# Altium footprint library PcbLib1.PcbLib: 8 footprints
Each footprint in its own frame and in the unit in brackets; x right, y up, seen from the top. Pads: shape width x height; smd on the part's side, far side on the other; paste and mask are expansions set on the pad; w line width, h text height; cw(c..) or ccw(c..) is an arc to the next point about the centre after c.
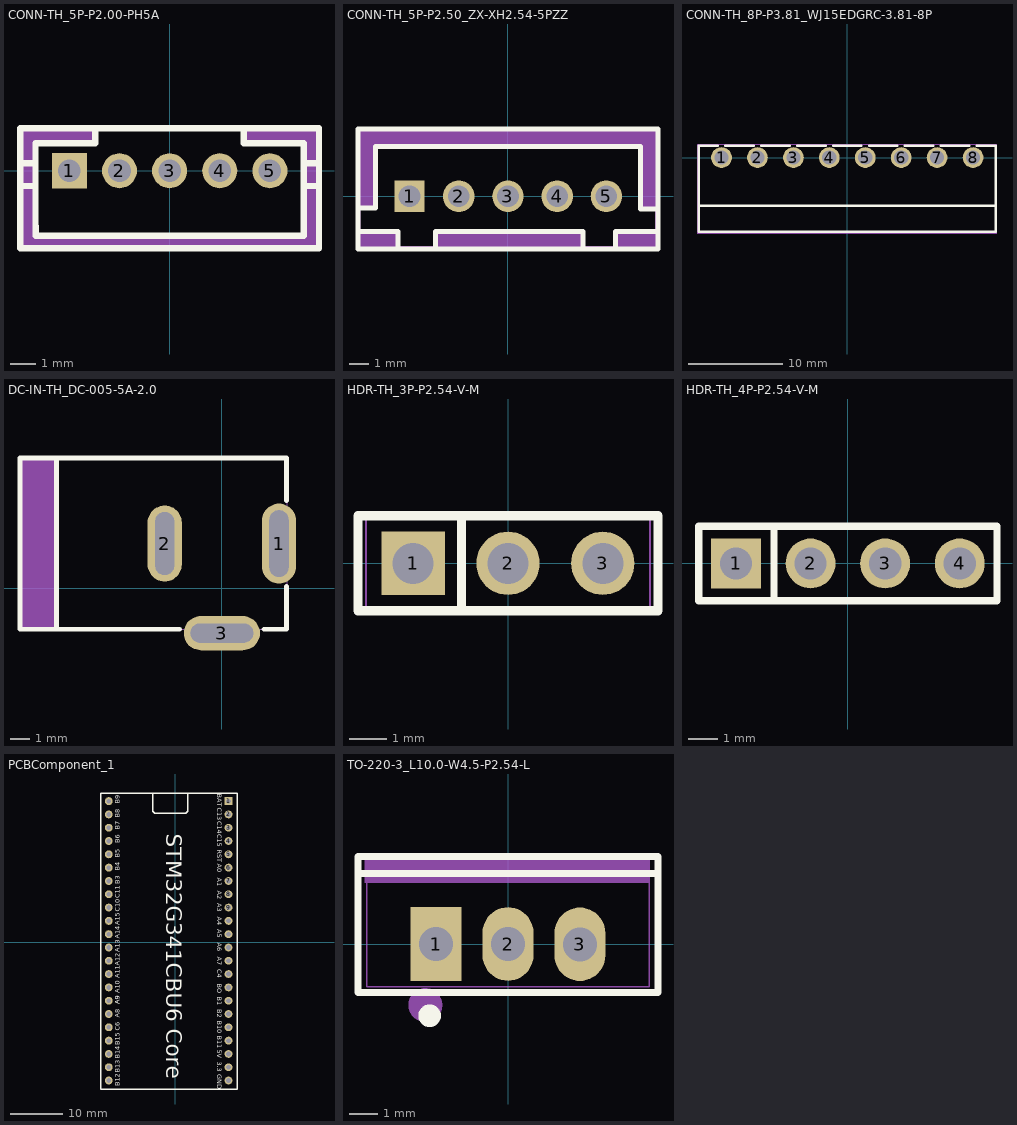
[diagram p0: the footprints below, top view; thin cyan lines are the x and y axes]

## CONN-TH_5P-P2.00-PH5A [mm]
pads (5):
  rect 1.4x1.4 hole 0.9: 1(-4,0)
  round 1.4 hole 0.9: 2(-2,0) 3(0,0) 4(2,0) 5(4,0)
Top Overlay:
  lines w0.254: -5.96,-2.794 -5.96,-0.61 ; -5.958,-2.794 -5.958,-3.099 5.959,-3.099 5.959,-2.794 ; -5.35,-2.21 -5.35,-0.61 ; -5.349,-2.21 -5.349,-2.601 5.35,-2.601 5.35,-2.21 ; 2.962,1.702 -2.962,1.702 ; 5.35,-2.21 5.35,-0.61 ; 5.96,-2.794 5.96,-0.61 ; -5.96,-0.61 -5.96,0.305 ; -5.96,-0.61 -5.35,-0.61 ; -5.96,0.305 -5.96,1.702 -2.962,1.702 ; -5.96,0.305 -5.35,0.305 ; -5.35,-0.61 -5.35,0.305 ; -5.35,0.305 -5.35,1.092 -2.962,1.092 -2.962,1.702 ; 5.35,-0.61 5.35,0.305 ; 5.35,-0.61 5.96,-0.61 ; 5.35,0.305 5.35,1.092 2.962,1.092 2.962,1.702 5.96,1.702 5.96,0.305 ; 5.35,0.305 5.96,0.305 ; 5.96,-0.61 5.96,0.305
Mechanical 6:
  region: 5.96,1.702 5.96,-3.098 5.959,-3.099 -5.958,-3.099 -5.958,1.701 -5.96,1.702 -2.962,1.702 -2.962,1.092 -5.35,1.092 -5.35,-2.6 -5.349,-2.601 5.35,-2.601 5.35,1.092 2.962,1.092 2.962,1.701 2.962,1.702
Mechanical 15:
  region: -3.75,-0.25 -4.25,-0.25 -4.25,0.25 -3.75,0.25
  region: -1.75,-0.25 -2.25,-0.25 -2.25,0.25 -1.75,0.25
  region: 0.25,-0.25 -0.25,-0.25 -0.25,0.25 0.25,0.25
  region: 2.25,-0.25 1.75,-0.25 1.75,0.25 2.25,0.25
  region: 4.25,-0.25 3.75,-0.25 3.75,0.25 4.25,0.25
  region: -5.89,-3.1 -5.89,-3.076 -5.925,-3.041 -5.974,-3.041 -6.009,-3.076 -6.01,-3.1 -6.009,-3.125 -5.974,-3.159 -5.925,-3.159 -5.89,-3.125 -5.89,-3.1
  lines w0.051: -5.95,-3.1 5.95,-3.1 5.95,1.7 -5.95,1.7 -5.95,-3.1

## CONN-TH_5P-P2.50_ZX-XH2.54-5PZZ [mm]
pads (5):
  rect 1.524x1.6 hole 1.1: 1(-5,0)
  round 1.6 hole 1.1: 2(-2.5,0) 3(0,0) 4(2.5,0) 5(5,0)
Top Overlay:
  lines w0.254: -7.62,-1.794 -5.588,-1.794 -5.588,-2.679 ; -7.619,-0.604 -6.73,-0.604 -6.73,2.528 6.732,2.528 6.732,-0.647 7.621,-0.647 ; -3.686,-2.679 -3.686,-1.79 3.81,-1.79 3.81,-2.679 ; 5.468,-2.679 5.468,-1.794 7.5,-1.794 ; -7.62,-2.679 -7.62,3.417 7.62,3.417 7.62,-2.679 -7.62,-2.679
Mechanical 6:
  region: -7.62,-1.794 -5.588,-1.794 -5.588,-2.679 -7.62,-2.679
  region: -3.686,-1.79 -3.686,-2.676 -3.683,-2.679 3.81,-2.679 3.81,-1.79
  region: -7.619,-0.604 -6.73,-0.604 -6.73,2.528 6.732,2.528 6.732,-0.647 7.621,-0.647 7.621,3.416 7.62,3.417 -7.62,3.417
  region: 5.468,-1.794 5.468,-2.679 7.62,-2.679 7.62,-1.914 7.62,-1.79 7.5,-1.794
Mechanical 15:
  region: 2.18,0.32 2.82,0.32 2.82,-0.32 2.18,-0.32
  region: -0.32,0.32 0.32,0.32 0.32,-0.32 -0.32,-0.32
  region: -2.82,0.32 -2.18,0.32 -2.18,-0.32 -2.82,-0.32
  region: -5.32,0.32 -4.68,0.32 -4.68,-0.32 -5.32,-0.32
  region: 4.68,0.32 5.32,0.32 5.32,-0.32 4.68,-0.32
  region: -7.44,-2.55 -7.44,-2.525 -7.475,-2.49 -7.525,-2.49 -7.56,-2.525 -7.56,-2.55 -7.56,-2.575 -7.525,-2.61 -7.475,-2.61 -7.44,-2.575 -7.44,-2.55
  lines w0.051: -7.5,-2.55 7.5,-2.55 7.5,3.35 -7.5,3.35 -7.5,-2.55

## CONN-TH_8P-P3.81_WJ15EDGRC-3.81-8P [mm]
pads (8):
  round 2.2 hole 1.5: 1(-13.335,0) 2(-9.525,0) 3(-5.715,0) 4(-1.905,0) 5(1.905,0) 6(5.715,0) 7(9.525,0) 8(13.335,0)
Top Overlay:
  lines w0.254: -15.748,-5.115 15.748,-5.115 ; -13.728,1.27 -15.748,1.27 -15.748,-7.874 15.748,-7.874 15.748,1.27 13.728,1.27 ; -12.942,1.27 -9.918,1.27 ; -9.132,1.27 -6.108,1.27 ; -5.322,1.27 -2.298,1.27 ; -1.512,1.27 1.512,1.27 ; 2.298,1.27 5.322,1.27 ; 6.108,1.27 9.132,1.27 ; 9.918,1.27 12.942,1.27
Mechanical 15:
  drawing of 13 lines, arcs and shapes, not listed

## DC-IN-TH_DC-005-5A-2.0 [mm]
pads (3):
  oval 1.8x4.2 hole 1 slot 3.5 at 90 deg: 1(3,2.352)
  oval 1.8x4 hole 1 slot 3.3 at 90 deg: 2(-3,2.352)
  oval 4x1.8 hole 1 slot 3.3 at 0 deg: 3(0,-2.352)
Top Overlay:
  lines w0.254: -8.681,-2.148 -8.681,6.852 ; -2.213,-2.148 -10.6,-2.148 -10.6,6.852 3.4,6.852 3.4,4.61 ; 2.212,-2.148 3.4,-2.148 3.4,0.094
Mechanical 6:
  region: -10.6,6.802 -8.75,6.802 -8.75,-2.148 -10.65,-2.148
Mechanical 15:
  region: -1.25,-2.498 1.25,-2.498 1.25,-2.098 -1.25,-2.098
  region: -1.25,-2.202 1.25,-2.202 1.25,-2.502 -1.25,-2.502
  region: -3.15,1.102 -3.15,3.602 -2.85,3.602 -2.85,1.102
  region: 3.15,3.602 3.15,1.102 2.85,1.102 2.85,3.602
  region: 3.463,6.852 3.463,6.876 3.428,6.91 3.379,6.91 3.344,6.876 3.343,6.852 3.344,6.827 3.379,6.793 3.428,6.793 3.463,6.827 3.463,6.852
  lines w0.051: -10.6,-2.148 -10.6,6.852 3.4,6.852 3.403,-2.148 -10.6,-2.148

## HDR-TH_3P-P2.54-V-M [mm]
pads (3):
  rect 1.7x1.7 hole 1.1: 1(-2.54,0)
  round 1.7 hole 1.1: 2(0,0) 3(2.54,0)
Top Overlay:
  lines w0.254: -1.246,-1.27 -1.246,1.27 ; -4.02,-1.27 -4.02,1.27 4.02,1.27 4.02,-1.27 -4.02,-1.27
Mechanical 15:
  region: -2.86,0.32 -2.22,0.32 -2.22,-0.32 -2.86,-0.32
  region: -0.32,0.32 0.32,0.32 0.32,-0.32 -0.32,-0.32
  region: 2.22,0.32 2.86,0.32 2.86,-0.32 2.22,-0.32
  region: -3.75,-1.25 -3.751,-1.226 -3.786,-1.191 -3.835,-1.191 -3.869,-1.226 -3.87,-1.25 -3.869,-1.275 -3.834,-1.309 -3.785,-1.309 -3.75,-1.274 -3.75,-1.25
  lines w0.051: -3.81,-1.25 3.81,-1.25 3.81,1.25 -3.81,1.25 -3.81,-1.25

## HDR-TH_4P-P2.54-V-M [mm]
pads (4):
  rect 1.7x1.7 hole 1.1: 1(-3.81,0)
  round 1.7 hole 1.1: 2(-1.27,0) 3(1.27,0) 4(3.81,0)
Top Overlay:
  lines w0.254: -2.516,-1.27 -2.516,1.27 ; -2.516,1.27 5.08,1.27 5.08,-1.27 -5.08,-1.27 -5.08,1.27 -2.516,1.27
Mechanical 15:
  region: -5.02,-1.25 -5.021,-1.226 -5.056,-1.192 -5.104,-1.192 -5.139,-1.226 -5.14,-1.25 -5.139,-1.274 -5.104,-1.308 -5.056,-1.308 -5.021,-1.274 -5.02,-1.25
  region: -4.13,0.32 -3.49,0.32 -3.49,-0.32 -4.13,-0.32
  region: -1.59,0.32 -0.95,0.32 -0.95,-0.32 -1.59,-0.32
  region: 0.95,0.32 1.59,0.32 1.59,-0.32 0.95,-0.32
  region: 3.49,0.32 4.13,0.32 4.13,-0.32 3.49,-0.32
  lines w0.051: -5.08,-1.25 -5.08,1.25 5.08,1.25 5.08,-1.25 -5.08,-1.25

## PCBComponent_1 [mm]
pads (44):
  rect 1.5x1.5 hole 0.9: 1(10.16,26.924)
  round 1.5 hole 0.9: 2(10.16,24.384) 3(10.16,21.844) 4(10.16,19.304) 5(10.16,16.764) 6(10.16,14.224) 7(10.16,11.684) 8(10.16,9.144) 9(10.16,6.604) 10(10.16,4.064) 11(10.16,1.524) 12(10.16,-1.016) 13(10.16,-3.556) 14(10.16,-6.096) 15(10.16,-8.636) 16(10.16,-11.176) 17(10.16,-13.716) 18(10.16,-16.256) 19(10.16,-18.796) 20(10.16,-21.336) 21(10.16,-23.876) 22(10.16,-26.416) 23(-12.7,-26.416) 24(-12.7,-23.876) 25(-12.7,-21.336) 26(-12.7,-18.796) 27(-12.7,-16.256) 28(-12.7,-13.716) 29(-12.7,-11.176) 30(-12.7,-8.636) 31(-12.7,-6.096) 32(-12.7,-3.556) 33(-12.7,-1.016) 34(-12.7,1.524) 35(-12.7,4.064) 36(-12.7,6.604) 37(-12.7,9.144) 38(-12.7,11.684) 39(-12.7,14.224) 40(-12.7,16.764) 41(-12.7,19.304) 42(-12.7,21.844) 43(-12.7,24.384) 44(-12.7,26.924)
Top Overlay:
  lines w0.254: -4.318,28.423 -4.318,25.019 -3.937,24.638 2.032,24.638 2.413,25.019 2.413,28.423 ; -14.224,-28.03 -14.224,28.423 11.811,28.423 11.811,-28.03 -14.224,-28.03
  text "B6" at -10.617,18.872 h0.94
  text "B5" at -10.617,16.104 h0.94
  text "B4" at -10.617,13.589 h0.94
  text "B3" at -10.617,11.074 h0.94
  text "C11" at -10.617,8.407 h0.94
  text "C10" at -10.617,5.817 h0.94
  text "A15" at -10.617,3.251 h0.94
  text "A14" at -10.617,0.66 h0.94
  text "A13" at -10.617,-1.905 h0.94
  text "A12" at -10.617,-4.496 h0.94
  text "A11" at -10.617,-6.883 h0.94
  text "A10" at -10.617,-9.728 h0.94
  text "A9" at -10.617,-11.836 h0.94
  text "A9" at -10.617,-11.836 h0.94
  text "A8" at -10.617,-14.427 h0.94
  text "B7" at -10.617,21.412 h0.94
  text "B8" at -10.617,23.749 h0.94
  text "B9" at -10.617,26.441 h0.94
  text "C6" at -10.617,-16.942 h0.94
  text "C4" at 8.001,-5.182 h0.94
  text "B11" at 8.001,-17.856 h0.94
  text "C15" at 8.001,20.625 h0.94
  text "GND" at 8.001,-25.222 h0.94
  text "3.3" at 8.001,-22.835 h0.94
  text "5V" at 8.001,-20.523 h0.94
  text "B10" at 8.001,-15.037 h0.94
  text "B2" at 8.001,-12.852 h0.94
  text "B1" at 8.001,-10.439 h0.94
  text "BO" at 8.001,-7.899 h0.94
  text "A7" at 8.001,-2.743 h0.94
  text "A6" at 8.001,-0.102 h0.94
  text "A5" at 8.001,2.438 h0.94
  text "A4" at 8.001,4.826 h0.94
  text "A3" at 8.001,7.468 h0.94
  text "A2" at 8.001,9.779 h0.94
  text "A1" at 8.001,12.319 h0.94
  text "A0" at 8.001,14.961 h0.94
  text "RST" at 8.001,17.678 h0.94
  text "C14" at 8.001,23.063 h0.94
  text "C13" at 8.001,25.654 h0.94
  text "BAT" at 8.001,28.296 h0.94
  text "B12" at -10.617,-27.534 h0.94
  text "B13" at -10.617,-24.917 h0.94
  text "B14" at -10.617,-22.276 h0.94
  text "B15" at -10.617,-19.71 h0.94
  text "STM32G341CBU6 Core" at -2.794,20.701 h5.08

## TO-220-3_L10.0-W4.5-P2.54-L [mm]
pads (3):
  rect 1.8x2.6 hole 1.2: 1(-2.54,0.005)
  oval 1.8x2.6 hole 1.2: 2(0,0.005)
  oval 1.8x2.6 hole 1.2 copper offset 0,0: 3(2.54,-0.005)
Top Overlay:
  lines w0.254: -5.3,2.495 5.3,2.495 ; -5.301,-1.704 5.301,-1.704 5.301,3.094 -5.301,3.094 -5.301,3.089 -5.301,-1.704
  lines w0.4: -2.77,-2.33 ccw(c-2.769,-2.53) -2.768,-2.33
Mechanical 6:
  circle w0.6: c-2.921,-2.154 r0.3
  region: -5.06,3.01 -5.06,2.17 4.99,2.17 4.99,3.01
Mechanical 15:
  region: -4.94,3 -4.94,3.025 -4.975,3.06 -5.025,3.06 -5.06,3.025 -5.06,3 -5.06,2.975 -5.025,2.94 -4.975,2.94 -4.94,2.975 -4.94,3
  region: -2.89,-0.32 -2.89,0.33 -2.19,0.33 -2.19,-0.32
  region: -0.35,-0.32 -0.35,0.33 0.35,0.33 0.35,-0.32
  region: 2.19,-0.33 2.19,0.32 2.89,0.32 2.89,-0.33
  lines w0.051: -5,-1.5 -5,3 5,3 5,-1.5 -5,-1.5